# Altium footprint library AD_Comments.PcbLib: 178 footprints (part 4 of 12)
Each footprint in its own frame and in the unit in brackets; x right, y up, seen from the top. Pads: shape width x height; smd on the part's side, far side on the other; paste and mask are expansions set on the pad; w line width, h text height; cw(c..) or ccw(c..) is an arc to the next point about the centre after c.
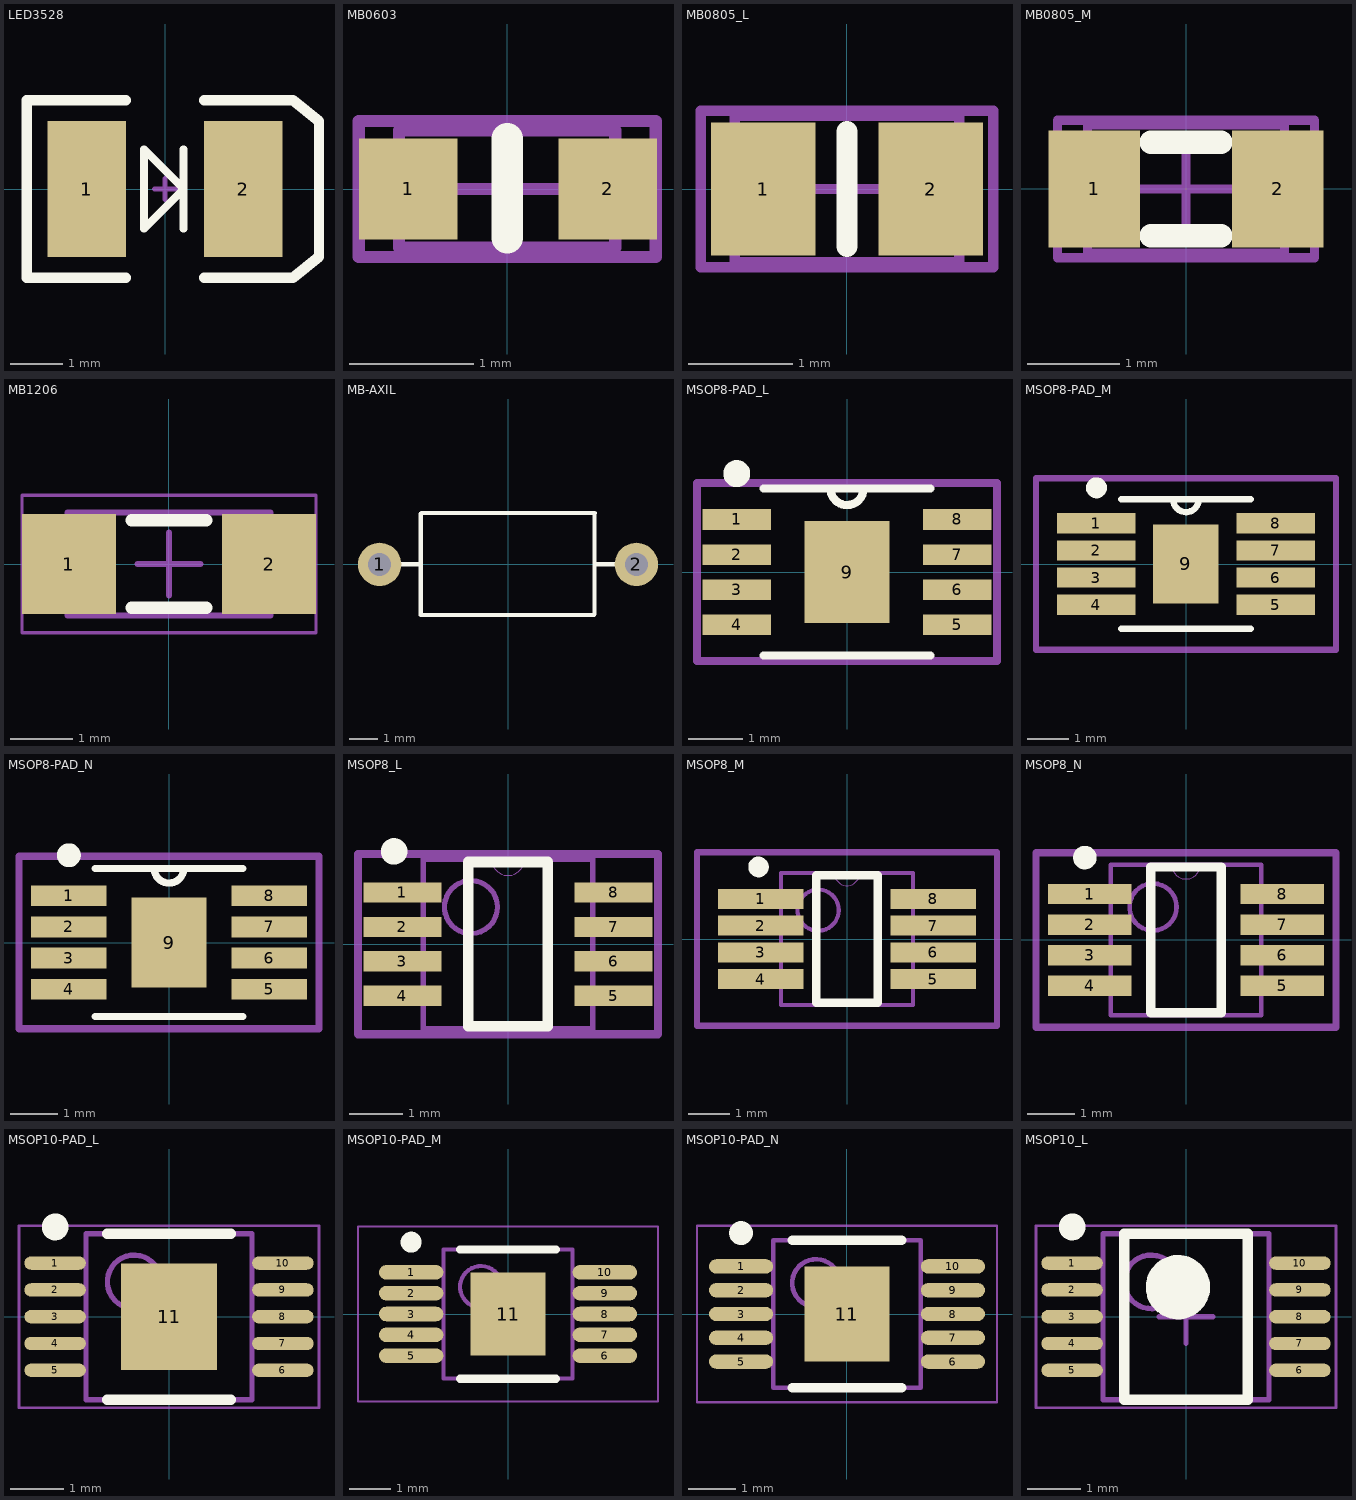
[diagram p3: the footprints below, top view; thin cyan lines are the x and y axes]

## LED3528 [mm] "SM LED; 2 C-Bend Leads; Body 3.5 x 2.8 x 1.9 mm, inc leads (LxWxH typ)"
height 1.9
pads (2):
  rect 1.5x2.6 smd: 1(-1.5,0) 2(1.5,0)
Top Overlay:
  lines w0.152: 0.356,-0.762 0.356,0 ; 0.356,0.762 0.356,0 ; 0.356,0 -0.406,-0.762 -0.406,0.762 0.356,0
  lines w0.2: -0.75,-1.7 -2.65,-1.7 -2.65,1.7 -0.75,1.7 ; 0.75,-1.7 2.45,-1.7 2.95,-1.3 2.95,1.3 2.45,1.7 0.75,1.7
Mechanical 1:
  lines w0.1: -0.2,0 0.2,0 ; 0,-0.2 0,0.2
3D body "User Library-KAA-3528.step": height 1.9, standoff 0, extent -1.75,-1.4 1.75,1.4

## MB0603 [mm] "Chip Resistor, Body 1.6x0.8mm, IPC High Density"
height 0.914
pads (2):
  rect 0.8x0.813 smd: 1(-0.8,0) 2(0.813,0)
Top Overlay:
  lines w0.254: 0,-0.394 0,0.406
Mechanical 13:
  lines w0.1: -0.875,-0.475 -0.875,0.475 0.875,0.475 0.875,-0.475 -0.875,-0.475
Mechanical 15:
  lines w0.1: -0.475,0 0.475,0 ; 0,-0.475 0,0.475 ; -1.2,-0.55 -1.2,0.55 1.2,0.55 1.2,-0.55 -1.2,-0.55
3D body "User Library-V0603HD.STEP": height 0.9, standoff 0, extent -0.8,-0.4 0.8,0.4

## MB0805_L [mm] "Chip Resistor, Body 2.0x1.2mm, IPC High Density"
height 0.7
pads (2):
  rect 1x1.27 smd: 1(-0.8,0) 2(0.8,0)
Top Overlay:
  lines w0.2: 0,-0.55 0,0.55
Mechanical 13:
  lines w0.1: -1.075,-0.7 1.075,-0.7 1.075,0.7 -1.075,0.7 -1.075,-0.7
Mechanical 15:
  lines w0.1: -0.5,0 0.5,0 ; 0,-0.5 0,0.5 ; -1.4,-0.75 1.4,-0.75 1.4,0.75 -1.4,0.75 -1.4,-0.75
3D body "User Library-V0805HD.STEP": height 1.2, standoff 0, extent -1,-0.625 1,0.625

## MB0805_M [mm] "Chip Resistor, Body 2.0x1.2mm, IPC Medium Density"
height 0.7
pads (2):
  rect 1x1.27 smd: 1(-1,0) 2(1,0)
Top Overlay:
  lines w0.254: -0.381,-0.508 0.381,-0.508 ; -0.381,0.508 0.381,0.508
Mechanical 13:
  lines w0.1: -1.075,-0.7 1.075,-0.7 1.075,0.7 -1.075,0.7 -1.075,-0.7
Mechanical 15:
  lines w0.1: -0.5,0 0.5,0 ; 0,-0.5 0,0.5 ; -1.4,-0.75 1.4,-0.75 1.4,0.75 -1.4,0.75 -1.4,-0.75
3D body "User Library-V0805HD.STEP": height 1.2, standoff 0, extent -1,-0.625 1,0.625

## MB1206 [mm] "Chip Resistor, 2-Leads, Body 3.20x1.60mm, IPC Medium Density"
height 0.6
pads (2):
  rect 1.5x1.6 smd: 1(-1.6,0) 2(1.6,0)
Top Overlay:
  lines w0.2: -0.6,-0.7 0.6,-0.7 ; -0.6,0.7 0.6,0.7
Mechanical 13:
  lines w0.1: -1.625,-0.825 1.625,-0.825 1.625,0.825 -1.625,0.825 -1.625,-0.825
Mechanical 15:
  lines w0.05: -2.35,-1.1 2.35,-1.1 2.35,1.1 -2.35,1.1 -2.35,-1.1
  lines w0.1: -0.5,0 0.5,0 ; 0,-0.5 0,0.5
3D body "User Library-ind_1206.STEP": height 1.1, standoff 0, extent -1.6,-0.8 1.6,0.8

## MB-AXIL [mm]
pads (2):
  round 1.5 hole 0.8: 1(-4.445,0) 2(4.445,0)
Top Overlay:
  lines w0.152: -4.039,0 -3.048,0 ; -3.023,1.747 -3.023,-1.753 2.977,-1.753 ; -2.997,1.778 3.003,1.778 ; 2.997,-1.727 2.997,1.773 ; 2.997,0 4.089,0
3D body "User Library-BL01RN1A1D2B-1.STEP": height 3.6, standoff -3.2, extent -4.825,-1.8 4.825,1.8

## MSOP8-PAD_L [mil] "MSOP, 8-Leads, Body 3.00x3.00mm, Pitch 0.65mm, Thermal Pad 1.89x1.57mm, IPC High Density"
pads (9):
  rect 50x15 smd: 1(-80.5,38.39) 2(-80.5,12.8) 3(-80.5,-12.8) 4(-80.5,-38.39) 5(80.5,-38.39) 6(80.5,-12.8) 7(80.5,12.8) 8(80.5,38.39)
  rect 61.81x74.41 smd: 9(0,0)
Top Overlay:
  circle w9.84: c-80.5,71.85 r4.92
  lines w6: -61,-61 61,-61 ; -61,61 61,61 ; -12.02,59.8 ccw(c0,61) 12.06,60.2
Mechanical 13:
  lines w0: -12,61 ccw(c0,61) 12,61
Mechanical 15:
  lines w6: -109.5,-65 109.5,-65 109.5,65 -109.5,65 -109.5,-65
3D body "DGN8_1P89X1P57-L.stp": height 43.1, standoff -2, extent -99.5,-61 99.5,61

## MSOP8-PAD_M [mil] "MSOP, 8-Leads, Body 3.00x3.00mm, Pitch 0.65mm, Thermal Pad 1.89x1.57mm, IPC Low Density"
pads (9):
  rect 74x19 smd: 1(-84.5,38.39) 2(-84.5,12.8) 3(-84.5,-12.8) 4(-84.5,-38.39) 5(84.5,-38.39) 6(84.5,-12.8) 7(84.5,12.8) 8(84.5,38.39)
  rect 61.81x74.41 smd: 9(-0.1,0.1)
Top Overlay:
  circle w9.84: c-84.5,71.85 r4.92
  lines w6: -61,-61 61,-61 ; -61,61 61,61 ; -12.02,59.8 ccw(c0,61) 12.06,60.2
Mechanical 13:
  lines w0: -12,61 ccw(c0,61) 12,61
Mechanical 15:
  lines w6: -141.5,-81 141.5,-81 141.5,81 -141.5,81 -141.5,-81
3D body "DGN8_1P89X1P57-M.stp": height 43.1, standoff -2, extent -99.5,-61 99.5,61

## MSOP8-PAD_N [mil] "MSOP, 8-Leads, Body 3.00x3.00mm, Pitch 0.65mm, Thermal Pad 1.89x1.57mm, IPC Medium Density"
pads (9):
  rect 62x17 smd: 1(-82.5,38.39) 2(-82.5,12.8) 3(-82.5,-12.8) 4(-82.5,-38.39) 5(82.5,-38.39) 6(82.5,-12.8) 7(82.5,12.8) 8(82.5,38.39)
  rect 61.81x74.41 smd: 9(0,0)
Top Overlay:
  circle w9.84: c-82.5,71.85 r4.92
  lines w6: -61,-61 61,-61 ; -61,61 61,61 ; -12.02,59.8 ccw(c0,61) 12.06,60.2
Mechanical 13:
  lines w0: -12,61 ccw(c0,61) 12,61
Mechanical 15:
  lines w6: -123.5,-71 123.5,-71 123.5,71 -123.5,71 -123.5,-71
3D body "DGN8_1P89x1P57.stp": height 43.1, standoff -2, extent -99.5,-61 99.5,61

## MSOP8_L [mil] "MSOP, 8-Leads, Body 3.00x3.00mm, Pitch 0.65mm,  IPC High Density"
pads (8):
  rect 58x15 smd mask+4: 1(-78.5,38.39) 2(-78.5,12.8) 3(-78.5,-12.8) 4(-78.5,-38.39) 5(78.5,-38.39) 6(78.5,-12.8) 7(78.5,12.8) 8(78.5,38.39)
Top Overlay:
  circle w9.84: c-84.65,68.9 r4.92
  lines w7.87: -29.53,-61.02 -29.53,61.02 29.53,61.02 29.53,-61.02 -29.53,-61.02
Mechanical 13:
  circle w3.94: c-27.56,27.56 r19.68
  lines w0: -12,63 ccw(c0,63) 12,63
  lines w3.94: -62.99,-62.99 -62.99,62.99 62.99,62.99 62.99,-62.99 -62.99,-62.99
Mechanical 15:
  lines w6: -111.5,-67 -111.5,67 111.5,67 111.5,-67 -111.5,-67
3D body "MSOP8.STEP": height 33.46, standoff -2.95, extent -98.42,-59.06 98.43,59.05

## MSOP8_M [mil] "MSOP, 8-Leads, Body 3.00x3.00mm, Pitch 0.65mm, IPC Medium Density"
pads (8):
  rect 82x19 smd mask+4: 1(-82.5,38.39) 2(-82.5,12.8) 3(-82.5,-12.8) 4(-82.5,-38.39) 5(82.5,-38.39) 6(82.5,-12.8) 7(82.5,12.8) 8(82.5,38.39)
Top Overlay:
  circle w9.84: c-84.65,68.9 r4.92
  lines w7.87: -29.53,-61.02 29.53,-61.02 29.53,61.02 -29.53,61.02 -29.53,-61.02
Mechanical 13:
  circle w3.94: c-27.56,27.56 r19.68
  lines w0: -12,63 ccw(c0,63) 12,63
  lines w3.94: -62.99,-62.99 62.99,-62.99 62.99,62.99 -62.99,62.99 -62.99,-62.99
Mechanical 15:
  lines w6: -143.5,-83 -143.5,83 143.5,83 143.5,-83 -143.5,-83
3D body "MSOP8.STEP": height 33.46, standoff -2.95, extent -98.42,-59.06 98.43,59.05

## MSOP8_N [mil] "MSOP, 8-Leads, Body 3.00x3.00mm, Pitch 0.65mm, IPC Normal Density"
pads (8):
  rect 70x17 smd mask+4: 1(-80.5,38.39) 2(-80.5,12.8) 3(-80.5,-12.8) 4(-80.5,-38.39) 5(80.5,-38.39) 6(80.5,-12.8) 7(80.5,12.8) 8(80.5,38.39)
Top Overlay:
  circle w9.84: c-84.65,68.9 r4.92
  lines w7.87: -29.53,-61.02 -29.53,61.02 29.53,61.02 29.53,-61.02 -29.53,-61.02
Mechanical 13:
  circle w3.94: c-27.56,27.56 r19.68
  lines w0: -12,63 ccw(c0,63) 12,63
  lines w3.94: -62.99,-62.99 -62.99,62.99 62.99,62.99 62.99,-62.99 -62.99,-62.99
Mechanical 15:
  lines w6: -125.5,-73 125.5,-73 125.5,73 -125.5,73 -125.5,-73
3D body "MSOP8.STEP": height 33.46, standoff -2.95, extent -98.42,-59.06 98.43,59.05

## MSOP10-PAD_L [mm] "MSOP, 10-Leads, Body 3.00x3.00mm, Pitch 0.50mm, Thermal Pad 1.99x1.79mm, IPC High Density"
height 1.1
pads (11):
  oval 1.15x0.25 smd: 1(-2.125,1) 2(-2.125,0.5) 3(-2.125,0) 4(-2.125,-0.5) 5(-2.125,-1) 6(2.125,-1) 7(2.125,-0.5) 8(2.125,0) 9(2.125,0.5) 10(2.125,1)
  rect 1.79x1.99 smd: 11(0,0)
Top Overlay:
  circle w0.25: c-2.125,1.675 r0.125
  lines w0.2: -1.15,-1.55 1.15,-1.55 ; -1.15,1.55 1.15,1.55
Mechanical 13:
  circle w0.1: c-0.65,0.65 r0.5
  lines w0.1: -1.55,-1.55 -1.55,1.55 1.55,1.55 1.55,-1.55 -1.55,-1.55
Mechanical 15:
  lines w0.05: -2.8,-1.7 -2.8,1.7 2.8,1.7 2.8,-1.7 -2.8,-1.7
  lines w0.1: -0.5,0 0.5,0 ; 0,-0.5 0,0.5
3D body "TSSOP50P490X110_HS-11L.step": height 1.1, standoff 0, extent -2.45,-1.55 2.45,1.55

## MSOP10-PAD_M [mm] "MSOP, 10-Leads, Body 3.00x3.00mm, Pitch 0.50mm, Thermal Pad 1.99x1.79mm, IPC Low Density"
height 1.1
pads (11):
  oval 1.55x0.35 smd: 1(-2.325,1) 2(-2.325,0.5) 3(-2.325,0) 4(-2.325,-0.5) 5(-2.325,-1) 6(2.325,-1) 7(2.325,-0.5) 8(2.325,0) 9(2.325,0.5) 10(2.325,1)
  rect 1.79x1.99 smd: 11(0,0)
Top Overlay:
  circle w0.25: c-2.325,1.725 r0.125
  lines w0.2: -1.15,-1.55 1.15,-1.55 ; -1.15,1.55 1.15,1.55
Mechanical 13:
  circle w0.1: c-0.65,0.65 r0.5
  lines w0.1: -1.55,-1.55 1.55,-1.55 1.55,1.55 -1.55,1.55 -1.55,-1.55
Mechanical 15:
  lines w0.05: -3.6,-2.1 3.6,-2.1 3.6,2.1 -3.6,2.1 -3.6,-2.1
  lines w0.1: -0.5,0 0.5,0 ; 0,-0.5 0,0.5
3D body "TSSOP50P490X110_HS-11M.step": height 1.1, standoff 0, extent -2.45,-1.55 2.45,1.55

## MSOP10-PAD_N [mm] "MSOP, 10-Leads, Body 3.00x3.00mm, Pitch 0.50mm, Thermal Pad 1.99x1.79mm, IPC Medium Density"
height 1.1
pads (11):
  oval 1.35x0.3 smd: 1(-2.225,1) 2(-2.225,0.5) 3(-2.225,0) 4(-2.225,-0.5) 5(-2.225,-1) 6(2.225,-1) 7(2.225,-0.5) 8(2.225,0) 9(2.225,0.5) 10(2.225,1)
  rect 1.79x1.99 smd: 11(0,0)
Top Overlay:
  circle w0.25: c-2.225,1.7 r0.125
  lines w0.2: -1.15,-1.55 1.15,-1.55 ; -1.15,1.55 1.15,1.55
Mechanical 13:
  circle w0.1: c-0.65,0.65 r0.5
  lines w0.1: -1.55,-1.55 1.55,-1.55 1.55,1.55 -1.55,1.55 -1.55,-1.55
Mechanical 15:
  lines w0.05: -3.15,-1.85 3.15,-1.85 3.15,1.85 -3.15,1.85 -3.15,-1.85
  lines w0.1: -0.5,0 0.5,0 ; 0,-0.5 0,0.5
3D body "TSSOP50P490X110_HS-11N.step": height 1.1, standoff 0, extent -2.45,-1.55 2.45,1.55

## MSOP10_L [mm] "MSOP, 10-Leads, Body 3.00x3.00mm, Pitch 0.50mm, IPC High Density"
height 1.1
pads (10):
  oval 1.15x0.25 smd: 1(-2.125,1) 2(-2.125,0.5) 3(-2.125,0) 4(-2.125,-0.5) 5(-2.125,-1) 6(2.125,-1) 7(2.125,-0.5) 8(2.125,0) 9(2.125,0.5) 10(2.125,1)
Top Overlay:
  circle w0.6: c-0.15,0.55 r0.3
  circle w0.25: c-2.125,1.675 r0.125
  lines w0.2: -1.15,-1.55 1.15,-1.55 1.15,1.55 -1.15,1.55 -1.15,-1.55
Mechanical 13:
  circle w0.1: c-0.65,0.65 r0.5
  lines w0.1: -1.55,-1.55 1.55,-1.55 1.55,1.55 -1.55,1.55 -1.55,-1.55
Mechanical 15:
  lines w0.05: -2.8,-1.7 2.8,-1.7 2.8,1.7 -2.8,1.7 -2.8,-1.7
  lines w0.1: -0.5,0 0.5,0 ; 0,-0.5 0,0.5
3D body "TSSOP50P490X110-10L.step": height 1.1, standoff 0, extent -2.45,-1.55 2.45,1.55